# Altium footprint library SparkFun.PCBLIB: 674 footprints (part 37 of 44)
Each footprint in its own frame and in the unit in brackets; x right, y up, seen from the top. Pads: shape width x height; smd on the part's side, far side on the other; paste and mask are expansions set on the pad; w line width, h text height; cw(c..) or ccw(c..) is an arc to the next point about the centre after c.
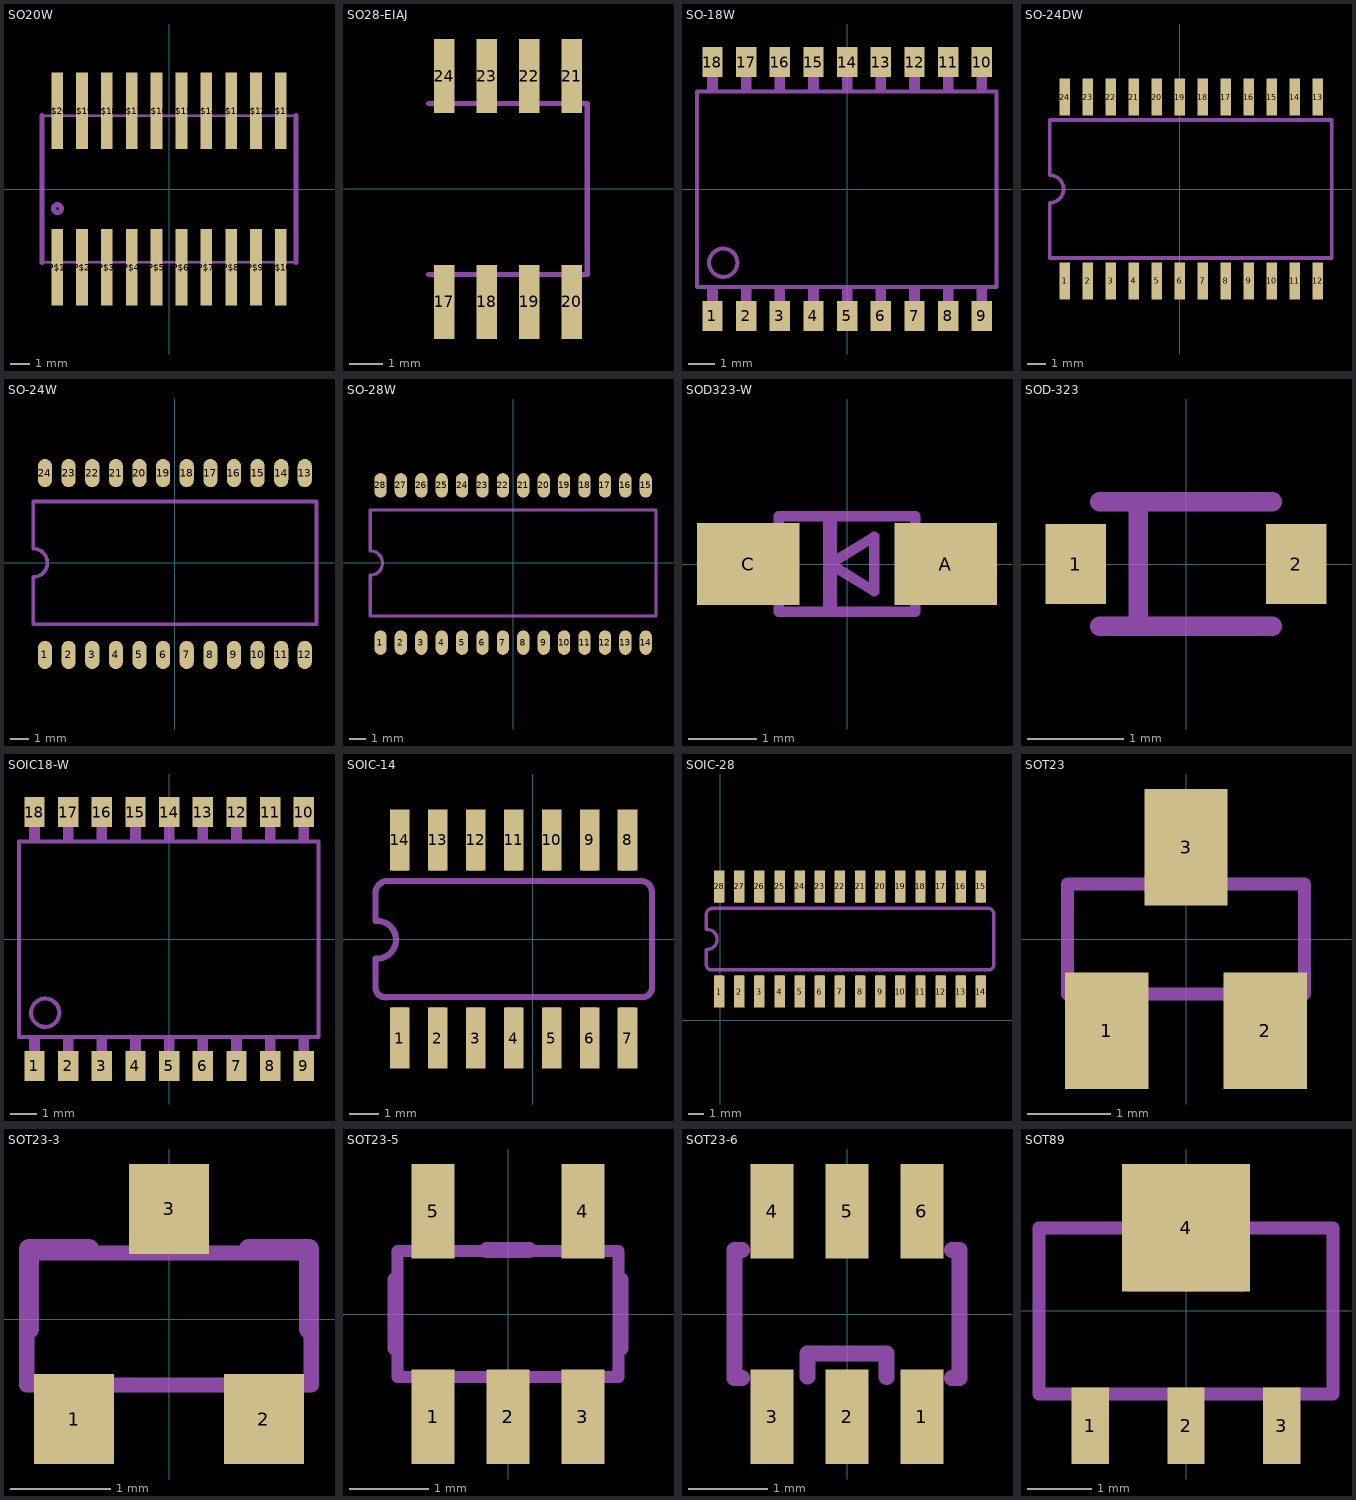
[diagram p36: the footprints below, top view; thin cyan lines are the x and y axes]

## SO20W [mm]
pads (20):
  rect 0.6x3.9 smd: P$1(-5.715,-4) P$2(-4.445,-4) P$3(-3.175,-4) P$4(-1.905,-4) P$5(-0.635,-4) P$6(0.635,-4) P$7(1.905,-4) P$8(3.175,-4) P$9(4.445,-4) P$10(5.715,-4) P$11(5.715,4) P$12(4.445,4) P$13(3.175,4) P$14(1.905,4) P$15(0.635,4) P$16(-0.635,4) P$17(-1.905,4) P$18(-3.175,4) P$19(-4.445,4) P$20(-5.715,4)
Mechanical 2:
  circle w0.254: c-5.7,-1 r0.2
  lines w0.254: -6.5,-3.75 -6.5,3.75 ; 6.5,-3.75 6.5,3.75
Mechanical 18:
  lines w0.127: -6.5,-3.75 6.5,-3.75 ; -6.5,3.75 6.5,3.75

## SO28-EIAJ [mil]
pads (8):
  rect 24x87 smd: 17(121.85,-133) 18(171.85,-133) 19(221.85,-133) 20(271.85,-133) 21(271.85,132) 22(221.85,132) 23(171.85,132) 24(121.85,132)
Mechanical 2:
  lines w6: 289.84,-100.98 289.84,99.98
Mechanical 18:
  rectangle: 114.85,-143 128.85,-103
  rectangle: 164.85,-143 178.85,-103
  rectangle: 214.85,-143 228.85,-103
  rectangle: 264.85,-143 278.85,-103
  rectangle: 114.85,102 128.85,142
  rectangle: 164.85,102 178.85,142
  rectangle: 214.85,102 228.85,142
  rectangle: 264.85,102 278.85,142
  lines w6: 103.86,-100.98 289.84,-100.98 ; 103.86,99.98 289.84,99.98

## SO-18W [mil]
pads (18):
  rect 30x45 smd: 1(-200,-188.5) 2(-150,-188.5) 3(-100,-188.5) 4(-50,-188.5) 5(0,-188.5) 6(50,-188.5) 7(100,-188.5) 8(150,-188.5) 9(200,-188.5) 10(200,188.5) 11(150,188.5) 12(100,188.5) 13(50,188.5) 14(0,188.5) 15(-50,188.5) 16(-100,188.5) 17(-150,188.5) 18(-200,188.5)
Mechanical 2:
  circle w6: c-184,-109.5 r21
  lines w6: -223,-145.5 222,-145.5 222,144.5 -223,144.5 -223,-145.5
Mechanical 18:
  rectangle: 192,146.5 208,199.5
  rectangle: 142,146.5 158,199.5
  rectangle: 92,146.5 108,199.5
  rectangle: 42,146.5 58,199.5
  rectangle: -8,146.5 8,199.5
  rectangle: -58,146.5 -42,199.5
  rectangle: -108,146.5 -92,199.5
  rectangle: -158,146.5 -142,199.5
  rectangle: -208,146.5 -192,199.5
  rectangle: -208,-200.5 -192,-147.5
  rectangle: -158,-200.5 -142,-147.5
  rectangle: -108,-200.5 -92,-147.5
  rectangle: -58,-200.5 -42,-147.5
  rectangle: -8,-200.5 8,-147.5
  rectangle: 42,-200.5 58,-147.5
  rectangle: 92,-200.5 108,-147.5
  rectangle: 142,-200.5 158,-147.5
  rectangle: 192,-200.5 208,-147.5

## SO-24DW [mil]
pads (24):
  rect 23x80 smd: 1(-250,-200) 2(-200,-200) 3(-150,-200) 4(-100,-200) 5(-50,-200) 6(0,-200) 7(50,-200) 8(100,-200) 9(150,-200) 10(200,-200) 11(250,-200) 12(300,-200) 13(300,200) 14(250,200) 15(200,200) 16(150,200) 17(100,200) 18(50,200) 19(0,200) 20(-50,200) 21(-100,200) 22(-150,200) 23(-200,200) 24(-250,200)
Mechanical 2:
  lines w8: -283,-150 331,-150 331,150 -283,150 -283,30 cw(c-283,0) -283,-30 -283,-150

## SO-24W [mil]
pads (24):
  rrect100% 30x60 smd: 1(-275,-195) 2(-225,-195) 3(-175,-195) 4(-125,-195) 5(-75,-195) 6(-25,-195) 7(25,-195) 8(75,-195) 9(125,-195) 10(175,-195) 11(225,-195) 12(275,-195) 13(275,190) 14(225,190) 15(175,190) 16(125,190) 17(75,190) 18(25,190) 19(-25,190) 20(-75,190) 21(-125,190) 22(-175,190) 23(-225,190) 24(-275,190)
Mechanical 2:
  lines w8: -300,-130 300,-130 300,130 -300,130 -300,30 cw(c-300,0) -300,-30 -300,-130

## SO-28W [mil]
pads (28):
  rrect100% 30x60 smd: 1(-325,-195) 2(-275,-195) 3(-225,-195) 4(-175,-195) 5(-125,-195) 6(-75,-195) 7(-25,-195) 8(25,-195) 9(75,-195) 10(125,-195) 11(175,-195) 12(225,-195) 13(275,-195) 14(325,-195) 15(325,190) 16(275,190) 17(225,190) 18(175,190) 19(125,190) 20(75,190) 21(25,190) 22(-25,190) 23(-75,190) 24(-125,190) 25(-175,190) 26(-225,190) 27(-275,190) 28(-325,190)
Mechanical 2:
  lines w8: -350,-130 350,-130 350,130 -350,130 -350,30 cw(c-350,0) -350,-30 -350,-130

## SOD323-W [mil]
pads (2):
  rect 59.06x47.24 smd: A(57.09,0) C(-57.09,0)
Mechanical 2:
  rectangle: -13.78,-27.56 -5.91,27.56
  lines w6: -9.84,0 15.75,15.75 15.75,-15.75 -9.84,0
Mechanical 18:
  lines w6: -39.37,-27.56 39.37,-27.56 39.37,27.56 -39.37,27.56 -39.37,-27.56

## SOD-323 [mil]
pads (2):
  rect 24.8x32.68 smd: 1(-45.28,0) 2(45.28,0)
Mechanical 2:
  lines w8: -35.43,-25.59 -19.69,-25.59 ; -35.43,25.59 -19.69,25.59 ; 35.43,-25.59 -19.69,-25.59 ; 35.43,25.59 -19.69,25.59 ; -19.69,-25.59 -19.69,25.59

## SOIC18-W [mil]
pads (18):
  rect 30x45 smd: 1(-200,-188.5) 2(-150,-188.5) 3(-100,-188.5) 4(-50,-188.5) 5(0,-188.5) 6(50,-188.5) 7(100,-188.5) 8(150,-188.5) 9(200,-188.5) 10(200,188.5) 11(150,188.5) 12(100,188.5) 13(50,188.5) 14(0,188.5) 15(-50,188.5) 16(-100,188.5) 17(-150,188.5) 18(-200,188.5)
Mechanical 2:
  circle w6: c-184,-109.5 r21
  lines w6: -223,-145.5 222,-145.5 222,144.5 -223,144.5 -223,-145.5
Mechanical 18:
  rectangle: 192,146.5 208,199.5
  rectangle: 142,146.5 158,199.5
  rectangle: 92,146.5 108,199.5
  rectangle: 42,146.5 58,199.5
  rectangle: -8,146.5 8,199.5
  rectangle: -58,146.5 -42,199.5
  rectangle: -108,146.5 -92,199.5
  rectangle: -158,146.5 -142,199.5
  rectangle: -208,146.5 -192,199.5
  rectangle: -208,-200.5 -192,-147.5
  rectangle: -158,-200.5 -142,-147.5
  rectangle: -108,-200.5 -92,-147.5
  rectangle: -58,-200.5 -42,-147.5
  rectangle: -8,-200.5 8,-147.5
  rectangle: 42,-200.5 58,-147.5
  rectangle: 92,-200.5 108,-147.5
  rectangle: 142,-200.5 158,-147.5
  rectangle: 192,-200.5 208,-147.5

## SOIC-14 [mil]
pads (14):
  rect 26x80 smd: 1(-175,-130.5) 2(-125,-130.5) 3(-75,-130.5) 4(-25,-130.5) 5(25,-130.5) 6(75,-130.5) 7(125,-130.5) 8(125,130.5) 9(75,130.5) 10(25,130.5) 11(-25,130.5) 12(-75,130.5) 13(-125,130.5) 14(-175,130.5)
Mechanical 2:
  lines w8: -207,-26 -207,-65.56 ccw(c-193.97,-63.6) -192,-76.63 145.94,-76.63 ccw(c143.97,-63.6) 157,-61.63 157,61.63 ccw(c142,61.63) 142,76.63 -192,76.63 ccw(c-190.03,59.66) -207,57.69 ; -207,24 -207,57.19 ; -205,-26 ccw(c-205,-1) -205,24
Mechanical 18:
  rectangle: -185,-147.5 -165,-89.5
  rectangle: -135,-147.5 -115,-89.5
  rectangle: -85,-147.5 -65,-89.5
  rectangle: -35,-147.5 -15,-89.5
  rectangle: 15,-147.5 35,-89.5
  rectangle: 65,-147.5 85,-89.5
  rectangle: 115,-147.5 135,-89.5
  rectangle: -185,89.5 -165,147.5
  rectangle: -135,89.5 -115,147.5
  rectangle: -85,89.5 -65,147.5
  rectangle: -35,89.5 -15,147.5
  rectangle: 15,89.5 35,147.5
  rectangle: 65,89.5 85,147.5
  rectangle: 115,89.5 135,147.5

## SOIC-28 [mil]
pads (28):
  rect 26x80 smd: 1(-2.56,70.68) 2(47.44,70.68) 3(97.44,70.68) 4(147.44,70.68) 5(197.44,70.68) 6(247.44,70.68) 7(297.44,70.68) 8(347.44,70.68) 9(397.44,70.68) 10(447.44,70.68) 11(497.44,70.68) 12(547.44,70.68) 13(597.44,70.68) 14(647.44,70.68) 15(647.44,331.68) 16(597.44,331.68) 17(547.44,331.68) 18(497.44,331.68) 19(447.44,331.68) 20(397.44,331.68) 21(347.44,331.68) 22(297.44,331.68) 23(247.44,331.68) 24(197.44,331.68) 25(147.44,331.68) 26(97.44,331.68) 27(47.44,331.68) 28(-2.56,331.68)
Mechanical 2:
  lines w8: -34.56,175.18 -34.56,135.62 ccw(c-21.54,137.58) -19.56,124.56 668.38,124.56 ccw(c666.41,137.59) 679.44,139.56 679.44,262.81 ccw(c664.44,262.81) 664.44,277.81 -19.56,277.81 ccw(c-17.59,260.84) -34.56,258.87 ; -34.56,225.18 -34.56,258.37 ; -32.56,175.18 ccw(c-32.56,200.18) -32.56,225.18
Mechanical 18:
  rectangle: -12.56,51.18 7.44,111.68
  rectangle: 37.44,53.68 57.44,111.68
  rectangle: 87.44,53.68 107.44,111.68
  rectangle: 137.44,53.68 157.44,111.68
  rectangle: 187.44,53.68 207.44,111.68
  rectangle: 237.44,53.68 257.44,111.68
  rectangle: 287.44,53.68 307.44,111.68
  rectangle: -12.56,290.68 7.44,348.68
  rectangle: 37.44,290.68 57.44,348.68
  rectangle: 87.44,290.68 107.44,348.68
  rectangle: 137.44,290.68 157.44,348.68
  rectangle: 187.44,290.68 207.44,348.68
  rectangle: 237.44,290.68 257.44,348.68
  rectangle: 287.44,290.68 307.44,348.68
  rectangle: 337.44,51.18 357.44,111.68
  rectangle: 387.44,53.68 407.44,111.68
  rectangle: 437.44,53.68 457.44,111.68
  rectangle: 487.44,53.68 507.44,111.68
  rectangle: 537.44,53.68 557.44,111.68
  rectangle: 587.44,53.68 607.44,111.68
  rectangle: 637.44,53.68 657.44,111.68
  rectangle: 337.44,290.68 357.44,348.68
  rectangle: 387.44,290.68 407.44,348.68
  rectangle: 437.44,290.68 457.44,348.68
  rectangle: 487.44,290.68 507.44,348.68
  rectangle: 537.44,290.68 557.44,348.68
  rectangle: 587.44,290.68 607.44,348.68
  rectangle: 637.44,290.68 657.44,348.68

## SOT23 [mm]
pads (3):
  rect 1x1.4 smd: 1(-0.95,-1.1) 2(0.95,-1.1) 3(0,1.1)
Mechanical 18:
  rectangle: -0.229,0.711 0.229,1.295
  rectangle: 0.711,-1.295 1.168,-0.711
  rectangle: -1.168,-1.295 -0.711,-0.711
  lines w0.152: -1.422,-0.66 1.422,-0.66 1.422,0.66 -1.422,0.66 -1.422,-0.66

## SOT23-3 [mil]
pads (3):
  rect 31.5x35.43 smd: 1(-37.4,-39.37) 2(37.4,-39.37) 3(0,43.31)
Mechanical 2:
  lines w8: -55.12,-3.94 -55.12,27.56 -31.5,27.56 ; 31.5,27.56 55.12,27.56 55.12,-3.94
Mechanical 18:
  lines w6: -56,-26 56,-26 56,26 -56,26 -56,-26

## SOT23-5 [mil]
pads (5):
  rect 21.65x47.24 smd: 1(-37.4,-51.19) 2(0,-51.19) 3(37.4,-51.19) 4(37.4,51.19) 5(-37.4,51.19)
Mechanical 2:
  lines w8: -56,-16.91 -56,16.91 ; -10.57,31.91 10.57,31.91 ; 56,-16.91 56,16.91
Mechanical 18:
  rectangle: -47.24,-59.06 -27.56,-33.46
  rectangle: -9.84,-59.06 9.84,-33.46
  rectangle: 27.56,-59.06 47.24,-33.46
  rectangle: 27.56,33.46 47.24,59.06
  rectangle: -47.24,33.46 -27.56,59.06
  lines w6: -55.12,-31.5 55.12,-31.5 55.12,31.5 -55.12,31.5 -55.12,-31.5

## SOT23-6 [mil]
pads (6):
  rect 21.65x47.24 smd: 1(37.4,-51.19) 2(0,-51.19) 3(-37.4,-51.19) 4(-37.4,51.19) 5(0,51.19) 6(37.4,51.19)
Mechanical 2:
  lines w8: -52.27,-31.91 -56,-31.91 -56,31.91 -52.27,31.91 ; -19.69,-31.1 -19.69,-19.69 19.69,-19.69 19.69,-31.5 ; 52.27,-31.91 56,-31.91 56,31.91 52.27,31.91

## SOT89 [mm]
pads (4):
  rect 0.58x1.2 smd: 1(-1.5,-1.8) 2(0,-1.8) 3(1.5,-1.8)
  rect 2x2 smd: 4(0,1.3)
Mechanical 2:
  lines w0.203: -2.3,-1.3 2.3,-1.3 2.3,1.3 -2.3,1.3 -2.3,-1.3
Mechanical 18:
  rectangle: -0.915,0.303 0.915,2.157
  rectangle: -1.74,-2.23 -1.26,-1.27
  rectangle: -0.24,-2.23 0.24,-1.27
  rectangle: 1.26,-2.23 1.74,-1.27